# Altium integrated library TI Power Management Battery Management.IntLib: 950 symbols (part 17 of 48)
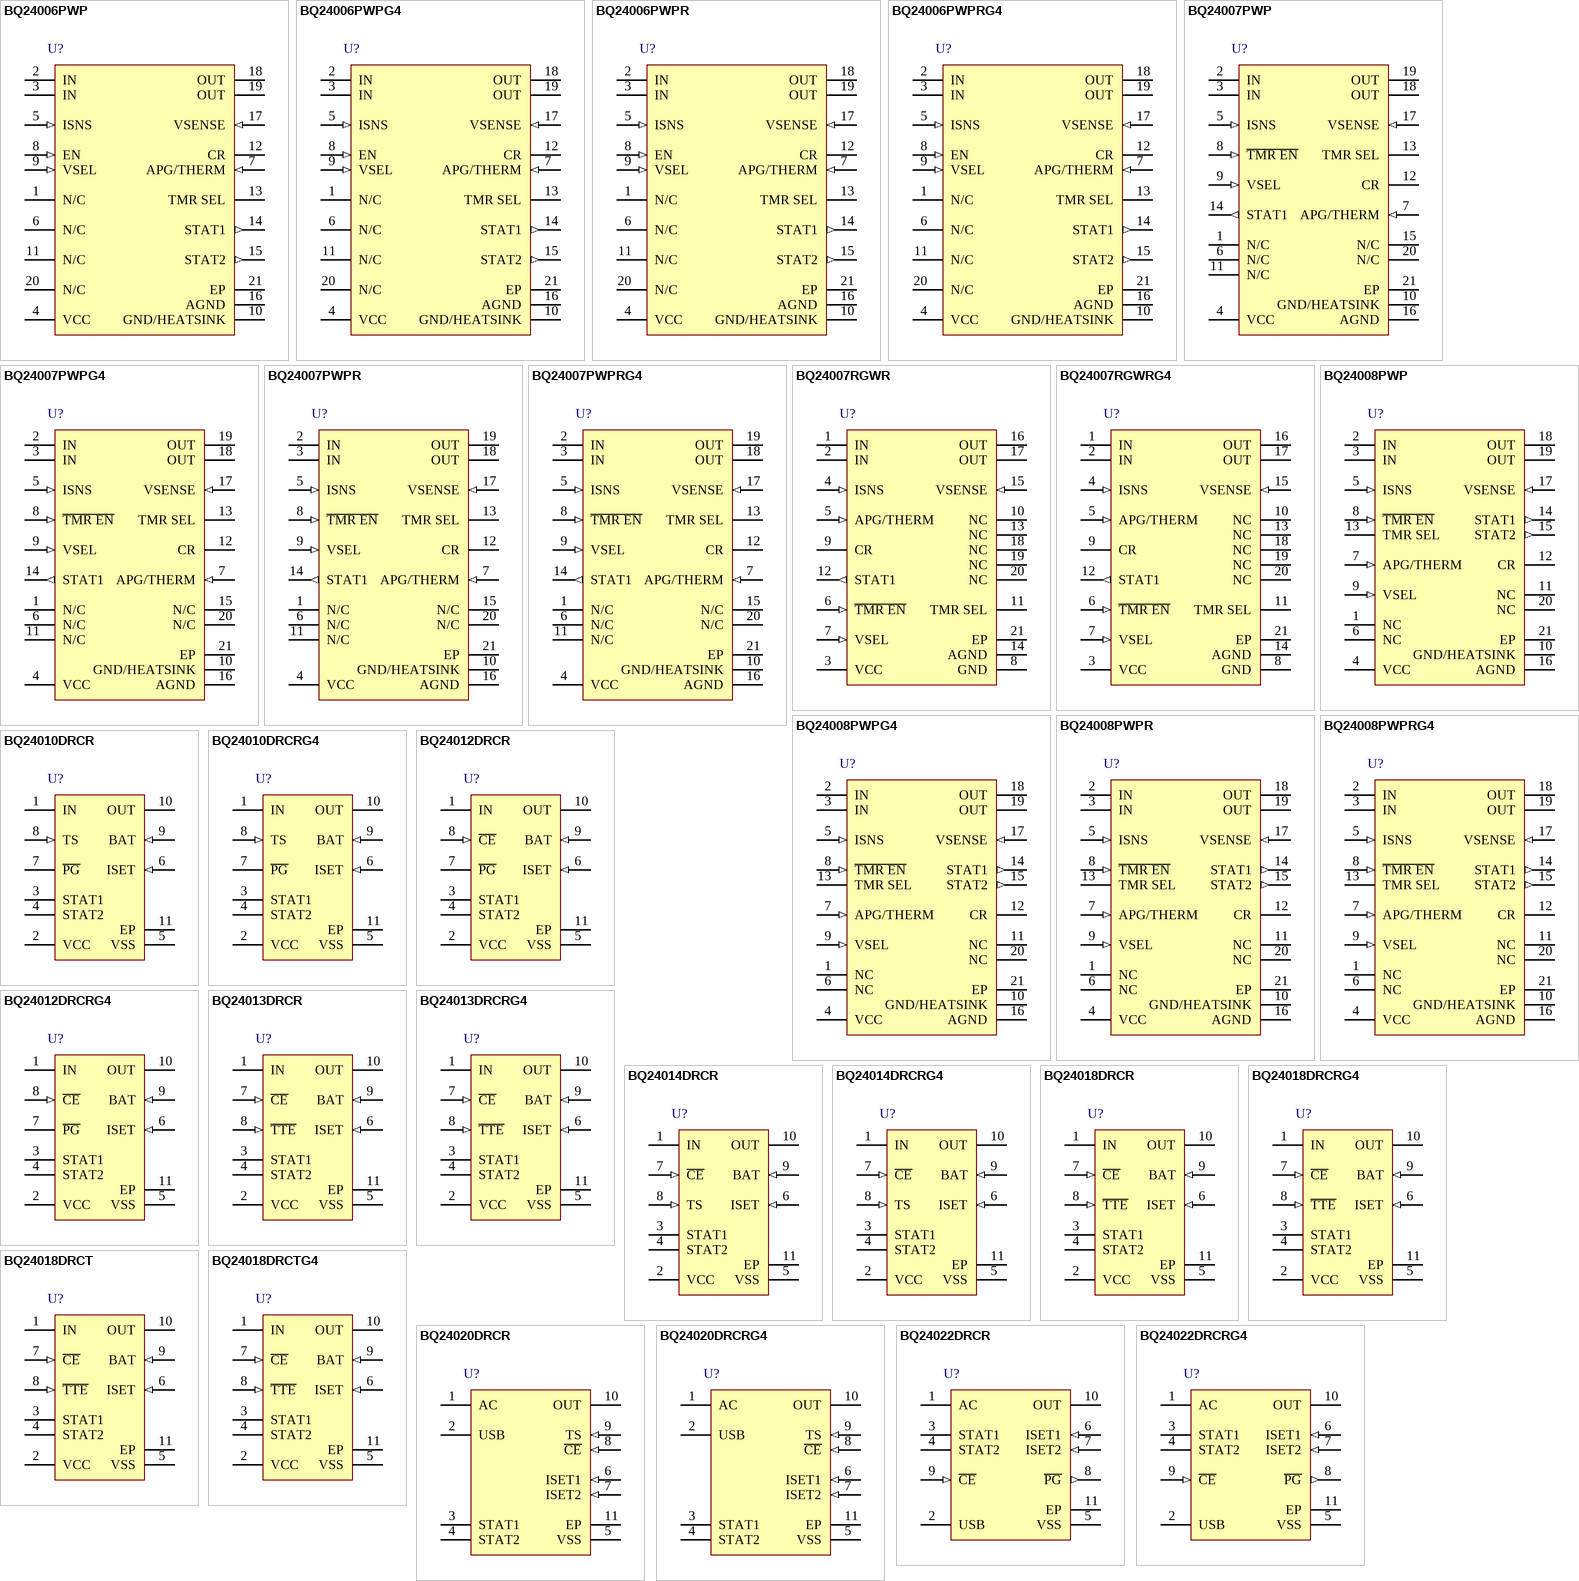
[diagram p50: symbols BQ24006PWP to BQ24022DRCRG4]

## BQ24014DRCRG4
designator U?
bqTINY(TM) Linear 1-Cell Li-Ion Charger with 1 A FET, Temp Sense & Charge Enable in QFN-10, 3 V, -40 to 85 degC, 10-pin SON (DRC), Green (RoHS & no Sb/Br); PartNumber: BQ24014DRCRG4; Manufacturer: Texas Instruments; Lead Acid: N; Li-Ion: Y; SubFamily: Battery Charge Management; Vin(Min)(V): 3; DatasheetVersion: SLUS530J; PackageVersion: revL, Sep-2011; PackageReference: DRC10-2400X1650TP; PackageDescription: 10-Pin Plastic Small Outline No-Lead, 3 x 3 x 1 mm Body, 0.5 mm Pitch, Exposed Pad; Supplier 1: Digi-Key; Supplier Part Number 1: BQ24014DRCRG4-ND; Supplier Part Number 3: 595-BQ24014DRCRG4; Eco-Plan: Green (RoHS & no Sb/Br); Li-Polymer: Y; NiCd: N; NiMH: N; Over Voltage Protection: N; Mounting Technology: Surface Mount; ComponentLink1Description: Datasheet; ComponentLink1URL: http://www.ti.com/general/docs/lit/getliterature.tsp?genericPartNumber=BQ24014&fileType=pdf
footprint DRC10-2400X1650TP (SON, 10-Leads, Body 3x3mm, Pitch 0.5mm, Thermal Pad 2.4x1.65mm, TI Recommended)
pins: 1 IN (power) "Charge input voltage. This input must be tied to the VCC pin.", 2 VCC (power) "VCC supply input", 3 STAT1 (oc) "Charge status output 1 (open collector)", 4 STAT2 (oc) "Charge status output 2 (open collector)", 5 VSS (power) "Ground input", 6 ISET (in) "Charge current set point", 7 ~{CE} (in) "Charge enable input (active low)", 8 TS (in) "Temperature sense input", 9 BAT (in) "Battery voltage sense input", 10 OUT (power) "Charge current output", 11 EP (power) "There is an internal electrical connection between the exposed thermal pad and VSS pin of the device. The exposed thermal pad must be connected to the same potential as the Vss pin on the printed circuit board. Do not use (See Datasheet)"

## BQ24018DRCR
designator U?
Single Chip Li-Ion Charge Management IC for Handheld Applications (bqTINY), 3 V, -40 to 125 degC, 10-pin SON (DRC), Green (RoHS & no Sb/Br); PartNumber: BQ24018DRCR; Manufacturer: Texas Instruments; Lead Acid: N; Li-Ion: Y; SubFamily: Battery Charge Management; Vin(Min)(V): 3; DatasheetVersion: SLUS530J; PackageVersion: revL, Sep-2011; PackageReference: DRC10-2400X1650TP; PackageDescription: 10-Pin Plastic Small Outline No-Lead, 3 x 3 x 1 mm Body, 0.5 mm Pitch, Exposed Pad; Supplier 1: Digi-Key; Supplier Part Number 1: 296-22086-2-ND; Supplier Part Number 3: 296-22086-6-ND; Eco-Plan: Green (RoHS & no Sb/Br); Li-Polymer: Y; NiCd: N; NiMH: N; Over Voltage Protection: N; Mounting Technology: Surface Mount; ComponentLink1Description: Datasheet; ComponentLink1URL: http://www.ti.com/general/docs/lit/getliterature.tsp?genericPartNumber=BQ24018&fileType=pdf
footprint DRC10-2400X1650TP (SON, 10-Leads, Body 3x3mm, Pitch 0.5mm, Thermal Pad 2.4x1.65mm, TI Recommended)
pins: 1 IN (power) "Charge input voltage. This input must be tied to the VCC pin.", 2 VCC (power) "VCC supply input", 3 STAT1 (oc) "Charge status output 1 (open collector)", 4 STAT2 (oc) "Charge status output 2 (open collector)", 5 VSS (power) "Ground input", 6 ISET (in) "Charge current set point", 7 ~{CE} (in) "Charge enable input (active low)", 8 ~{TTE} (in) "Timer and termination enable input (active low)", 9 BAT (in) "Battery voltage sense input", 10 OUT (power) "Charge current output", 11 EP (power) "There is an internal electrical connection between the exposed thermal pad and VSS pin of the device. The exposed thermal pad must be connected to the same potential as the Vss pin on the printed circuit board. Do not use (See Datasheet)"

## BQ24018DRCRG4
designator U?
Single Chip Li-Ion Charge Management IC for Handheld Applications (bqTINY), 3 V, -40 to 125 degC, 10-pin SON (DRC), Green (RoHS & no Sb/Br); PartNumber: BQ24018DRCRG4; Manufacturer: Texas Instruments; Lead Acid: N; Li-Ion: Y; SubFamily: Battery Charge Management; Vin(Min)(V): 3; DatasheetVersion: SLUS530J; PackageVersion: revL, Sep-2011; PackageReference: DRC10-2400X1650TP; PackageDescription: 10-Pin Plastic Small Outline No-Lead, 3 x 3 x 1 mm Body, 0.5 mm Pitch, Exposed Pad; Supplier 1: Digi-Key; Supplier Part Number 1: BQ24018DRCRG4-ND; Supplier Part Number 3: 595-BQ24018DRCRG4; Eco-Plan: Green (RoHS & no Sb/Br); Li-Polymer: Y; NiCd: N; NiMH: N; Over Voltage Protection: N; Mounting Technology: Surface Mount; ComponentLink1Description: Datasheet; ComponentLink1URL: http://www.ti.com/general/docs/lit/getliterature.tsp?genericPartNumber=BQ24018&fileType=pdf
footprint DRC10-2400X1650TP (SON, 10-Leads, Body 3x3mm, Pitch 0.5mm, Thermal Pad 2.4x1.65mm, TI Recommended)
pins: 1 IN (power) "Charge input voltage. This input must be tied to the VCC pin.", 2 VCC (power) "VCC supply input", 3 STAT1 (oc) "Charge status output 1 (open collector)", 4 STAT2 (oc) "Charge status output 2 (open collector)", 5 VSS (power) "Ground input", 6 ISET (in) "Charge current set point", 7 ~{CE} (in) "Charge enable input (active low)", 8 ~{TTE} (in) "Timer and termination enable input (active low)", 9 BAT (in) "Battery voltage sense input", 10 OUT (power) "Charge current output", 11 EP (power) "There is an internal electrical connection between the exposed thermal pad and VSS pin of the device. The exposed thermal pad must be connected to the same potential as the Vss pin on the printed circuit board. Do not use (See Datasheet)"

## BQ24018DRCT
designator U?
Single Chip Li-Ion Charge Management IC for Handheld Applications (bqTINY), 3 V, -40 to 125 degC, 10-pin SON (DRC), Green (RoHS & no Sb/Br); PartNumber: BQ24018DRCT; Manufacturer: Texas Instruments; Lead Acid: N; Li-Ion: Y; SubFamily: Battery Charge Management; Vin(Min)(V): 3; DatasheetVersion: SLUS530J; PackageVersion: revL, Sep-2011; PackageReference: DRC10-2400X1650TP; PackageDescription: 10-Pin Plastic Small Outline No-Lead, 3 x 3 x 1 mm Body, 0.5 mm Pitch, Exposed Pad; Supplier 1: Digi-Key; Supplier Part Number 1: BQ24018DRCT-ND; Supplier Part Number 3: 33P6574; Eco-Plan: Green (RoHS & no Sb/Br); Li-Polymer: Y; NiCd: N; NiMH: N; Over Voltage Protection: N; Mounting Technology: Surface Mount; ComponentLink1Description: Datasheet; ComponentLink1URL: http://www.ti.com/general/docs/lit/getliterature.tsp?genericPartNumber=BQ24018&fileType=pdf
footprint DRC10-2400X1650TP (SON, 10-Leads, Body 3x3mm, Pitch 0.5mm, Thermal Pad 2.4x1.65mm, TI Recommended)
pins: 1 IN (power) "Charge input voltage. This input must be tied to the VCC pin.", 2 VCC (power) "VCC supply input", 3 STAT1 (oc) "Charge status output 1 (open collector)", 4 STAT2 (oc) "Charge status output 2 (open collector)", 5 VSS (power) "Ground input", 6 ISET (in) "Charge current set point", 7 ~{CE} (in) "Charge enable input (active low)", 8 ~{TTE} (in) "Timer and termination enable input (active low)", 9 BAT (in) "Battery voltage sense input", 10 OUT (power) "Charge current output", 11 EP (power) "There is an internal electrical connection between the exposed thermal pad and VSS pin of the device. The exposed thermal pad must be connected to the same potential as the Vss pin on the printed circuit board. Do not use (See Datasheet)"

## BQ24018DRCTG4
designator U?
Single Chip Li-Ion Charge Management IC for Handheld Applications (bqTINY), 3 V, -40 to 125 degC, 10-pin SON (DRC), Green (RoHS & no Sb/Br); PartNumber: BQ24018DRCTG4; Manufacturer: Texas Instruments; Lead Acid: N; Li-Ion: Y; SubFamily: Battery Charge Management; Vin(Min)(V): 3; DatasheetVersion: SLUS530J; PackageVersion: revL, Sep-2011; PackageReference: DRC10-2400X1650TP; PackageDescription: 10-Pin Plastic Small Outline No-Lead, 3 x 3 x 1 mm Body, 0.5 mm Pitch, Exposed Pad; Supplier 1: Digi-Key; Supplier Part Number 1: BQ24018DRCTG4-ND; Supplier Part Number 3: 595-BQ24018DRCTG4; Eco-Plan: Green (RoHS & no Sb/Br); Li-Polymer: Y; NiCd: N; NiMH: N; Over Voltage Protection: N; Mounting Technology: Surface Mount; ComponentLink1Description: Datasheet; ComponentLink1URL: http://www.ti.com/general/docs/lit/getliterature.tsp?genericPartNumber=BQ24018&fileType=pdf
footprint DRC10-2400X1650TP (SON, 10-Leads, Body 3x3mm, Pitch 0.5mm, Thermal Pad 2.4x1.65mm, TI Recommended)
pins: 1 IN (power) "Charge input voltage. This input must be tied to the VCC pin.", 2 VCC (power) "VCC supply input", 3 STAT1 (oc) "Charge status output 1 (open collector)", 4 STAT2 (oc) "Charge status output 2 (open collector)", 5 VSS (power) "Ground input", 6 ISET (in) "Charge current set point", 7 ~{CE} (in) "Charge enable input (active low)", 8 ~{TTE} (in) "Timer and termination enable input (active low)", 9 BAT (in) "Battery voltage sense input", 10 OUT (power) "Charge current output", 11 EP (power) "There is an internal electrical connection between the exposed thermal pad and VSS pin of the device. The exposed thermal pad must be connected to the same potential as the Vss pin on the printed circuit board. Do not use (See Datasheet)"

## BQ24020DRCR
designator U?
bqTINY-II Dual Input USB / AC Adpater 1-Cell Li-Ion Charger with Charge Enable & Temp Sense in QFN-10, 4.5 V, -40 to 125 degC, 10-pin SON (DRC), Green (RoHS & no Sb/Br); PartNumber: BQ24020DRCR; Manufacturer: Texas Instruments; Lead Acid: N; Li-Ion: Y; SubFamily: Battery Charge Management; Vin(Min)(V): 4.5; DatasheetVersion: SLUS549E; PackageVersion: revL, Sep-2011; PackageReference: DRC10-2400X1650TP; PackageDescription: 10-Pin Plastic Small Outline No-Lead, 3 x 3 x 1 mm Body, 0.5 mm Pitch, Exposed Pad; Supplier 1: Digi-Key; Supplier Part Number 1: 296-14072-2-ND; Supplier Part Number 3: 296-14072-6-ND; Eco-Plan: Green (RoHS & no Sb/Br); Li-Polymer: Y; NiCd: N; NiMH: N; Over Voltage Protection: N; Mounting Technology: Surface Mount; ComponentLink1Description: Datasheet; ComponentLink1URL: http://www.ti.com/general/docs/lit/getliterature.tsp?genericPartNumber=BQ24020&fileType=pdf
footprint DRC10-2400X1650TP (SON, 10-Leads, Body 3x3mm, Pitch 0.5mm, Thermal Pad 2.4x1.65mm, TI Recommended)
pins: 1 AC (power) "AC charge input voltage", 2 USB (power) "USB charge input voltage", 3 STAT1 (oc) "Charge status output 1 (open-drain)", 4 STAT2 (oc) "Charge status output 2 (open-drain)", 5 VSS (power) "Ground input", 6 ISET1 (in) "Charge current set point for AC input and precharge ande taper set point for both AC and USB", 7 ISET2 (in) "Charge current set point for USB port (high=500 mA, low=100 mA, hi-z = disable USB charge)", 8 ~{CE} (in) "Charge enable input (active low)", 9 TS (in) "Temperature sense input", 10 OUT (power) "Charge current output", 11 EP (power) "There is an internal electrical connection between the exposed thermal pad and VSS pin of the device. The exposed thermal pad must be connected to the same potential as the VSS pin on the printed circuit board. Do not use (See Datasheet)"

## BQ24020DRCRG4
designator U?
bqTINY-II Dual Input USB / AC Adpater 1-Cell Li-Ion Charger with Charge Enable & Temp Sense in QFN-10, 4.5 V, -40 to 125 degC, 10-pin SON (DRC), Green (RoHS & no Sb/Br); PartNumber: BQ24020DRCRG4; Manufacturer: Texas Instruments; Lead Acid: N; Li-Ion: Y; SubFamily: Battery Charge Management; Vin(Min)(V): 4.5; DatasheetVersion: SLUS549E; PackageVersion: revL, Sep-2011; PackageReference: DRC10-2400X1650TP; PackageDescription: 10-Pin Plastic Small Outline No-Lead, 3 x 3 x 1 mm Body, 0.5 mm Pitch, Exposed Pad; Supplier 1: Digi-Key; Supplier Part Number 1: BQ24020DRCRG4-ND; Supplier Part Number 3: 595-BQ24020DRCRG4; Eco-Plan: Green (RoHS & no Sb/Br); Li-Polymer: Y; NiCd: N; NiMH: N; Over Voltage Protection: N; Mounting Technology: Surface Mount; ComponentLink1Description: Datasheet; ComponentLink1URL: http://www.ti.com/general/docs/lit/getliterature.tsp?genericPartNumber=BQ24020&fileType=pdf
footprint DRC10-2400X1650TP (SON, 10-Leads, Body 3x3mm, Pitch 0.5mm, Thermal Pad 2.4x1.65mm, TI Recommended)
pins: 1 AC (power) "AC charge input voltage", 2 USB (power) "USB charge input voltage", 3 STAT1 (oc) "Charge status output 1 (open-drain)", 4 STAT2 (oc) "Charge status output 2 (open-drain)", 5 VSS (power) "Ground input", 6 ISET1 (in) "Charge current set point for AC input and precharge ande taper set point for both AC and USB", 7 ISET2 (in) "Charge current set point for USB port (high=500 mA, low=100 mA, hi-z = disable USB charge)", 8 ~{CE} (in) "Charge enable input (active low)", 9 TS (in) "Temperature sense input", 10 OUT (power) "Charge current output", 11 EP (power) "There is an internal electrical connection between the exposed thermal pad and VSS pin of the device. The exposed thermal pad must be connected to the same potential as the VSS pin on the printed circuit board. Do not use (See Datasheet)"

## BQ24022DRCR
designator U?
bqTINY-II Dual Input USB / AC Adpater 1-Cell Li-Ion Charger with Charge Enable & Power Good in QFN-10, 4.5 V, -40 to 125 degC, 10-pin SON (DRC), Green (RoHS & no Sb/Br); PartNumber: BQ24022DRCR; Manufacturer: Texas Instruments; Lead Acid: N; Li-Ion: Y; SubFamily: Battery Charge Management; Vin(Min)(V): 4.5; DatasheetVersion: SLUS549E; PackageVersion: revL, Sep-2011; PackageReference: DRC10-2400X1650TP; PackageDescription: 10-Pin Plastic Small Outline No-Lead, 3 x 3 x 1 mm Body, 0.5 mm Pitch, Exposed Pad; Supplier 1: Digi-Key; Supplier Part Number 1: 296-14397-2-ND; Supplier Part Number 3: 296-14397-6-ND; Eco-Plan: Green (RoHS & no Sb/Br); Li-Polymer: Y; NiCd: N; NiMH: N; Over Voltage Protection: N; Mounting Technology: Surface Mount; ComponentLink1Description: Datasheet; ComponentLink1URL: http://www.ti.com/general/docs/lit/getliterature.tsp?genericPartNumber=BQ24022&fileType=pdf
footprint DRC10-2400X1650TP (SON, 10-Leads, Body 3x3mm, Pitch 0.5mm, Thermal Pad 2.4x1.65mm, TI Recommended)
pins: 1 AC (power) "AC charge input voltage", 2 USB (power) "USB charge input voltage", 3 STAT1 (oc) "Charge status output 1 (open-drain)", 4 STAT2 (oc) "Charge status output 2 (open-drain)", 5 VSS (power) "Ground input", 6 ISET1 (in) "Charge current set point for AC input and precharge ande taper set point for both AC and USB", 7 ISET2 (in) "Charge current set point for USB port (high=500 mA, low=100 mA, hi-z = disable USB charge)", 8 ~{PG} (out) "powergood status output (active low)", 9 ~{CE} (in) "Charge enable input (active low)", 10 OUT (power) "Charge current output", 11 EP (power) "There is an internal electrical connection between the exposed thermal pad and VSS pin of the device. The exposed thermal pad must be connected to the same potential as the VSS pin on the printed circuit board. Do not use (See Datasheet)"

## BQ24022DRCRG4
designator U?
bqTINY-II Dual Input USB / AC Adpater 1-Cell Li-Ion Charger with Charge Enable & Power Good in QFN-10, 4.5 V, -40 to 125 degC, 10-pin SON (DRC), Green (RoHS & no Sb/Br); PartNumber: BQ24022DRCRG4; Manufacturer: Texas Instruments; Lead Acid: N; Li-Ion: Y; SubFamily: Battery Charge Management; Vin(Min)(V): 4.5; DatasheetVersion: SLUS549E; PackageVersion: revL, Sep-2011; PackageReference: DRC10-2400X1650TP; PackageDescription: 10-Pin Plastic Small Outline No-Lead, 3 x 3 x 1 mm Body, 0.5 mm Pitch, Exposed Pad; Supplier 1: Digi-Key; Supplier Part Number 1: BQ24022DRCRG4-ND; Supplier Part Number 3: 595-BQ24022DRCRG4; Eco-Plan: Green (RoHS & no Sb/Br); Li-Polymer: Y; NiCd: N; NiMH: N; Over Voltage Protection: N; Mounting Technology: Surface Mount; ComponentLink1Description: Datasheet; ComponentLink1URL: http://www.ti.com/general/docs/lit/getliterature.tsp?genericPartNumber=BQ24022&fileType=pdf
footprint DRC10-2400X1650TP (SON, 10-Leads, Body 3x3mm, Pitch 0.5mm, Thermal Pad 2.4x1.65mm, TI Recommended)
pins: 1 AC (power) "AC charge input voltage", 2 USB (power) "USB charge input voltage", 3 STAT1 (oc) "Charge status output 1 (open-drain)", 4 STAT2 (oc) "Charge status output 2 (open-drain)", 5 VSS (power) "Ground input", 6 ISET1 (in) "Charge current set point for AC input and precharge ande taper set point for both AC and USB", 7 ISET2 (in) "Charge current set point for USB port (high=500 mA, low=100 mA, hi-z = disable USB charge)", 8 ~{PG} (out) "powergood status output (active low)", 9 ~{CE} (in) "Charge enable input (active low)", 10 OUT (power) "Charge current output", 11 EP (power) "There is an internal electrical connection between the exposed thermal pad and VSS pin of the device. The exposed thermal pad must be connected to the same potential as the VSS pin on the printed circuit board. Do not use (See Datasheet)"

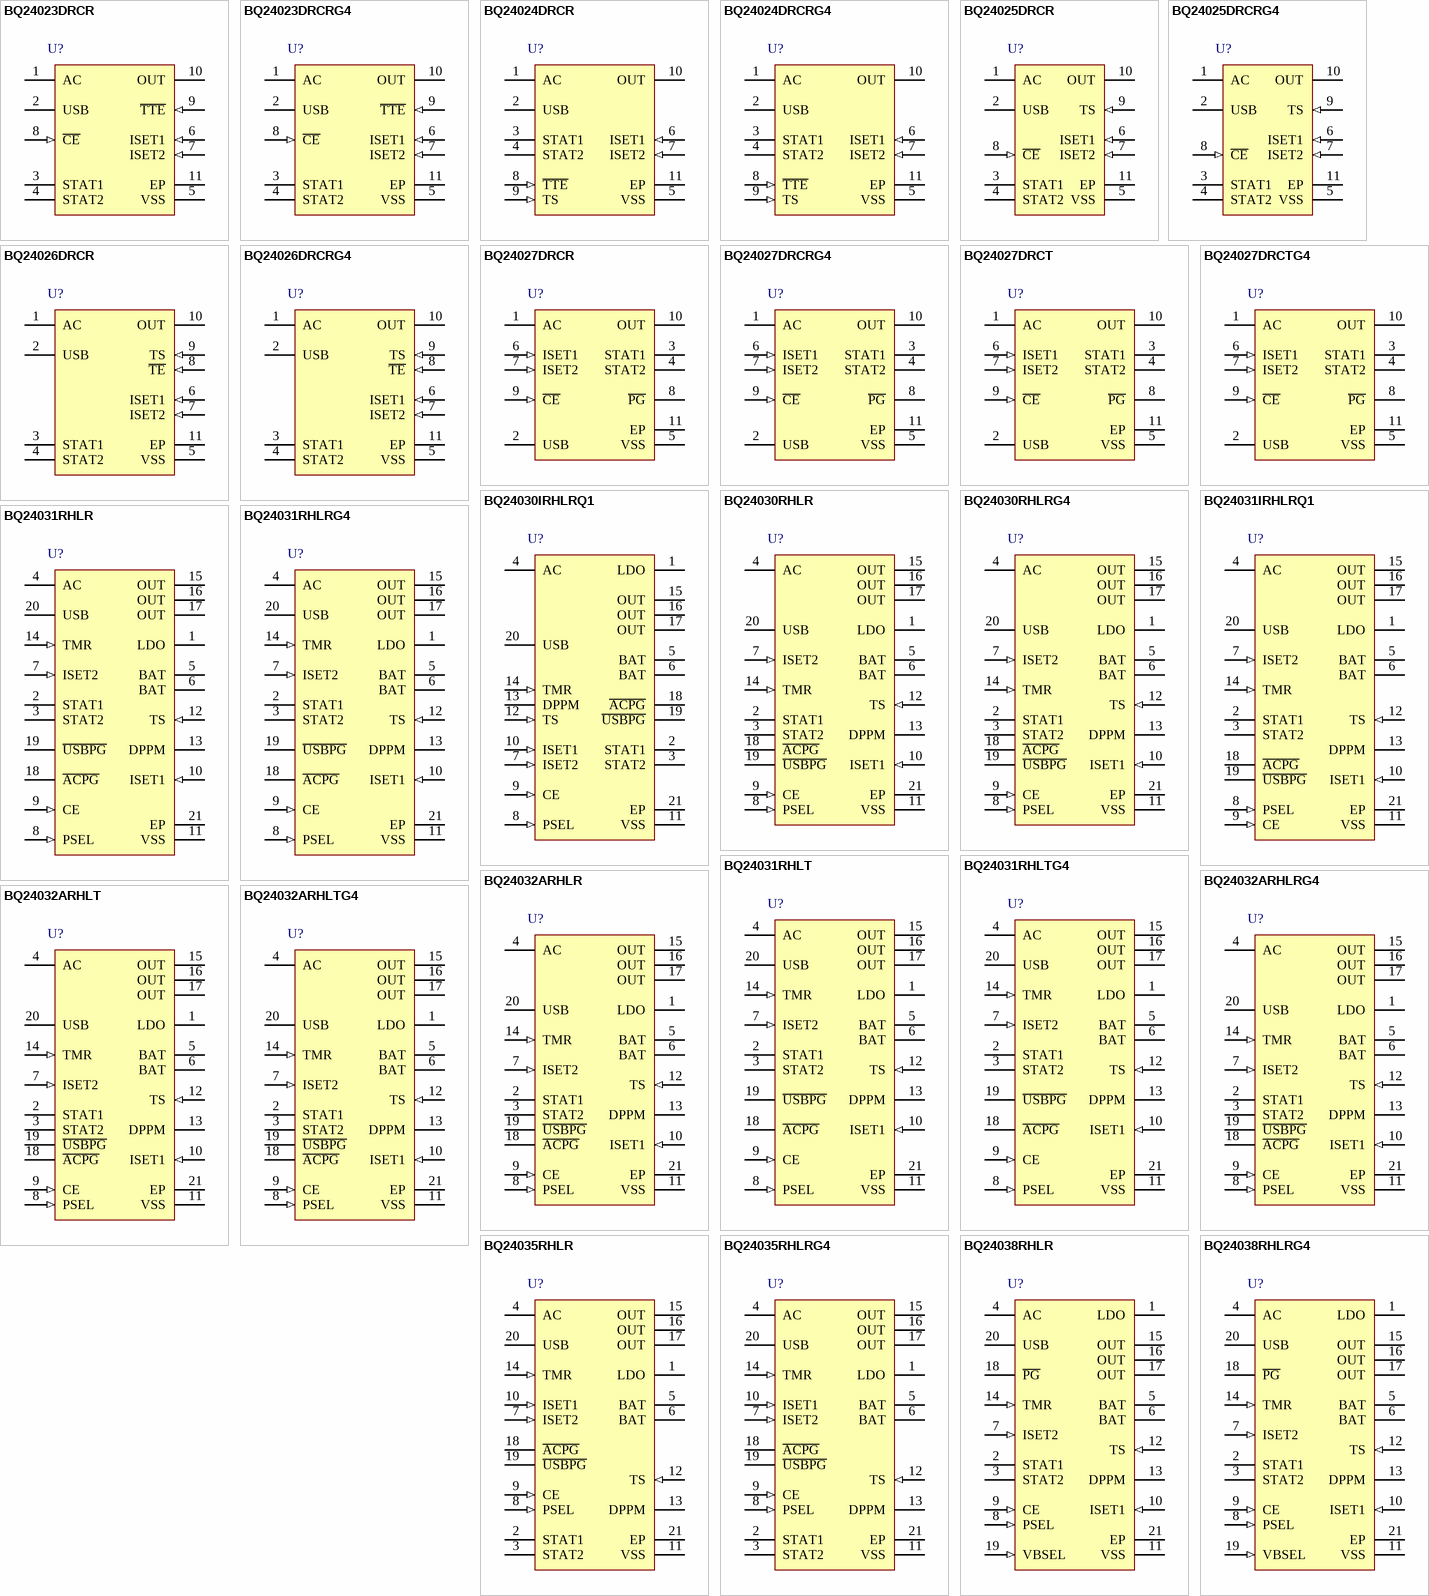
[diagram p13: symbols BQ24023DRCR to BQ24038RHLRG4]

## BQ24023DRCR
designator U?
bqTINY-II Dual Input USB / AC Adpater 1-Cell Li-Ion Charger with Charge Enable, Term Enable in QFN-10, 4.5 V, -40 to 85 degC, 10-pin SON (DRC), Green (RoHS & no Sb/Br); PartNumber: BQ24023DRCR; Manufacturer: Texas Instruments; Lead Acid: N; Li-Ion: Y; SubFamily: Battery Charge Management; Vin(Min)(V): 4.5; DatasheetVersion: SLUS549E; PackageVersion: revL, Sep-2011; PackageReference: DRC10-2400X1650TP; PackageDescription: 10-Pin Plastic Small Outline No-Lead, 3 x 3 x 1 mm Body, 0.5 mm Pitch, Exposed Pad; Supplier 1: Digi-Key; Supplier Part Number 1: 296-15182-2-ND; Supplier Part Number 3: 296-15182-6-ND; Eco-Plan: Green (RoHS & no Sb/Br); Li-Polymer: Y; NiCd: N; NiMH: N; Over Voltage Protection: N; Mounting Technology: Surface Mount; ComponentLink1Description: Datasheet; ComponentLink1URL: http://www.ti.com/general/docs/lit/getliterature.tsp?genericPartNumber=BQ24023&fileType=pdf
footprint DRC10-2400X1650TP (SON, 10-Leads, Body 3x3mm, Pitch 0.5mm, Thermal Pad 2.4x1.65mm, TI Recommended)
pins: 1 AC (power) "AC charge input voltage", 2 USB (power) "USB charge input voltage", 3 STAT1 (oc) "Charge status output 1 (open-drain)", 4 STAT2 (oc) "Charge status output 2 (open-drain)", 5 VSS (power) "Ground input", 6 ISET1 (in) "Charge current set point for AC input and precharge ande taper set point for both AC and USB", 7 ISET2 (in) "Charge current set point for USB port (high=500 mA, low=100 mA, hi-z = disable USB charge)", 8 ~{CE} (in) "Charge enable input (active low)", 9 ~{TTE} (in) "Timer and termination enable input (active low)", 10 OUT (power) "Charge current output", 11 EP (power) "There is an internal electrical connection between the exposed thermal pad and VSS pin of the device. The exposed thermal pad must be connected to the same potential as the VSS pin on the printed circuit board. Do not use (See Datasheet)"

## BQ24023DRCRG4
designator U?
bqTINY-II Dual Input USB / AC Adpater 1-Cell Li-Ion Charger with Charge Enable, Term Enable in QFN-10, 4.5 V, -40 to 85 degC, 10-pin SON (DRC), Green (RoHS & no Sb/Br); PartNumber: BQ24023DRCRG4; Manufacturer: Texas Instruments; Lead Acid: N; Li-Ion: Y; SubFamily: Battery Charge Management; Vin(Min)(V): 4.5; DatasheetVersion: SLUS549E; PackageVersion: revL, Sep-2011; PackageReference: DRC10-2400X1650TP; PackageDescription: 10-Pin Plastic Small Outline No-Lead, 3 x 3 x 1 mm Body, 0.5 mm Pitch, Exposed Pad; Supplier 1: Digi-Key; Supplier Part Number 1: BQ24023DRCRG4-ND; Supplier Part Number 3: 595-BQ24023DRCRG4; Eco-Plan: Green (RoHS & no Sb/Br); Li-Polymer: Y; NiCd: N; NiMH: N; Over Voltage Protection: N; Mounting Technology: Surface Mount; ComponentLink1Description: Datasheet; ComponentLink1URL: http://www.ti.com/general/docs/lit/getliterature.tsp?genericPartNumber=BQ24023&fileType=pdf
footprint DRC10-2400X1650TP (SON, 10-Leads, Body 3x3mm, Pitch 0.5mm, Thermal Pad 2.4x1.65mm, TI Recommended)
pins: 1 AC (power) "AC charge input voltage", 2 USB (power) "USB charge input voltage", 3 STAT1 (oc) "Charge status output 1 (open-drain)", 4 STAT2 (oc) "Charge status output 2 (open-drain)", 5 VSS (power) "Ground input", 6 ISET1 (in) "Charge current set point for AC input and precharge ande taper set point for both AC and USB", 7 ISET2 (in) "Charge current set point for USB port (high=500 mA, low=100 mA, hi-z = disable USB charge)", 8 ~{CE} (in) "Charge enable input (active low)", 9 ~{TTE} (in) "Timer and termination enable input (active low)", 10 OUT (power) "Charge current output", 11 EP (power) "There is an internal electrical connection between the exposed thermal pad and VSS pin of the device. The exposed thermal pad must be connected to the same potential as the VSS pin on the printed circuit board. Do not use (See Datasheet)"

## BQ24024DRCR
designator U?
bqTINY-II Dual Input USB / AC Adpater 1-Cell Li-Ion Charger with Term Enable & Temp Sense in QFN-10, 4.5 V, -40 to 125 degC, 10-pin SON (DRC), Green (RoHS & no Sb/Br); PartNumber: BQ24024DRCR; Manufacturer: Texas Instruments; Lead Acid: N; Li-Ion: Y; SubFamily: Battery Charge Management; Vin(Min)(V): 4.5; DatasheetVersion: SLUS549E; PackageVersion: revL, Sep-2011; PackageReference: DRC10-2400X1650TP; PackageDescription: 10-Pin Plastic Small Outline No-Lead, 3 x 3 x 1 mm Body, 0.5 mm Pitch, Exposed Pad; Supplier 1: Digi-Key; Supplier Part Number 1: 296-17054-2-ND; Supplier Part Number 3: 296-17054-6-ND; Eco-Plan: Green (RoHS & no Sb/Br); Li-Polymer: Y; NiCd: N; NiMH: N; Over Voltage Protection: N; Mounting Technology: Surface Mount; ComponentLink1Description: Datasheet; ComponentLink1URL: http://www.ti.com/general/docs/lit/getliterature.tsp?genericPartNumber=BQ24024&fileType=pdf
footprint DRC10-2400X1650TP (SON, 10-Leads, Body 3x3mm, Pitch 0.5mm, Thermal Pad 2.4x1.65mm, TI Recommended)
pins: 1 AC (power) "AC charge input voltage", 2 USB (power) "USB charge input voltage", 3 STAT1 (oc) "Charge status output 1 (open-drain)", 4 STAT2 (oc) "Charge status output 2 (open-drain)", 5 VSS (power) "Ground input", 6 ISET1 (in) "Charge current set point for AC input and precharge ande taper set point for both AC and USB", 7 ISET2 (in) "Charge current set point for USB port (high=500 mA, low=100 mA, hi-z = disable USB charge)", 8 ~{TTE} (in) "Timer and termination enable input (active low)", 9 TS (in) "Temperature sense input", 10 OUT (power) "Charge current output", 11 EP (power) "There is an internal electrical connection between the exposed thermal pad and VSS pin of the device. The exposed thermal pad must be connected to the same potential as the VSS pin on the printed circuit board. Do not use (See Datasheet)"

## BQ24024DRCRG4
designator U?
bqTINY-II Dual Input USB / AC Adpater 1-Cell Li-Ion Charger with Term Enable & Temp Sense in QFN-10, 4.5 V, -40 to 125 degC, 10-pin SON (DRC), Green (RoHS & no Sb/Br); PartNumber: BQ24024DRCRG4; Manufacturer: Texas Instruments; Lead Acid: N; Li-Ion: Y; SubFamily: Battery Charge Management; Vin(Min)(V): 4.5; DatasheetVersion: SLUS549E; PackageVersion: revL, Sep-2011; PackageReference: DRC10-2400X1650TP; PackageDescription: 10-Pin Plastic Small Outline No-Lead, 3 x 3 x 1 mm Body, 0.5 mm Pitch, Exposed Pad; Supplier 1: Digi-Key; Supplier Part Number 1: BQ24024DRCRG4-ND; Supplier Part Number 3: 595-BQ24024DRCRG4; Eco-Plan: Green (RoHS & no Sb/Br); Li-Polymer: Y; NiCd: N; NiMH: N; Over Voltage Protection: N; Mounting Technology: Surface Mount; ComponentLink1Description: Datasheet; ComponentLink1URL: http://www.ti.com/general/docs/lit/getliterature.tsp?genericPartNumber=BQ24024&fileType=pdf
footprint DRC10-2400X1650TP (SON, 10-Leads, Body 3x3mm, Pitch 0.5mm, Thermal Pad 2.4x1.65mm, TI Recommended)
pins: 1 AC (power) "AC charge input voltage", 2 USB (power) "USB charge input voltage", 3 STAT1 (oc) "Charge status output 1 (open-drain)", 4 STAT2 (oc) "Charge status output 2 (open-drain)", 5 VSS (power) "Ground input", 6 ISET1 (in) "Charge current set point for AC input and precharge ande taper set point for both AC and USB", 7 ISET2 (in) "Charge current set point for USB port (high=500 mA, low=100 mA, hi-z = disable USB charge)", 8 ~{TTE} (in) "Timer and termination enable input (active low)", 9 TS (in) "Temperature sense input", 10 OUT (power) "Charge current output", 11 EP (power) "There is an internal electrical connection between the exposed thermal pad and VSS pin of the device. The exposed thermal pad must be connected to the same potential as the VSS pin on the printed circuit board. Do not use (See Datasheet)"

## BQ24025DRCR
designator U?
bqTINY-II Dual Input USB / AC Adpater 1-Cell Li-Ion Charger with Charge Enable & Temp Sense, 7 hr Timer, 4.5 V, -40 to 85 degC, 10-pin SON (DRC), Green (RoHS & no Sb/Br); PartNumber: BQ24025DRCR; Manufacturer: Texas Instruments; Lead Acid: N; SubFamily: Battery Charge Management; Vin(Min)(V): 4.5; DatasheetVersion: SLUS549E; PackageVersion: revL, Sep-2011; PackageReference: DRC10-2400X1650TP; PackageDescription: 10-Pin Plastic Small Outline No-Lead, 3 x 3 x 1 mm Body, 0.5 mm Pitch, Exposed Pad; Supplier 1: Digi-Key; Supplier Part Number 1: 296-15760-2-ND; Supplier Part Number 3: 296-15760-6-ND; Eco-Plan: Green (RoHS & no Sb/Br); Li-Ion: N; Li-Polymer: N; NiCd: N; NiMH: N; Over Voltage Protection: N; Mounting Technology: Surface Mount; ComponentLink1Description: Datasheet; ComponentLink1URL: http://www.ti.com/general/docs/lit/getliterature.tsp?genericPartNumber=BQ24025&fileType=pdf
footprint DRC10-2400X1650TP (SON, 10-Leads, Body 3x3mm, Pitch 0.5mm, Thermal Pad 2.4x1.65mm, TI Recommended)
pins: 1 AC (power) "AC charge input voltage", 2 USB (power) "USB charge input voltage", 3 STAT1 (oc) "Charge status output 1 (open-drain)", 4 STAT2 (oc) "Charge status output 2 (open-drain)", 5 VSS (power) "Ground input", 6 ISET1 (in) "Charge current set point for AC input and precharge and taper set point for both AC and USB", 7 ISET2 (in) "Charge current set point for USB port (high=500 mA, low=100 mA, hi-z = disable USB charge)", 8 ~{CE} (in) "Charge enable input (active low)", 9 TS (in) "Temperature sense input", 10 OUT (power) "Charge current output", 11 EP (power) "There is an internal electrical connection between the exposed thermal pad and VSS pin of the device. The exposed thermal pad must be connected to the same potential as the VSS pin on the printed circuit board. Do not use (See Datasheet)"

## BQ24025DRCRG4
designator U?
bqTINY-II Dual Input USB / AC Adpater 1-Cell Li-Ion Charger with Charge Enable & Temp Sense, 7 hr Timer, 4.5 V, -40 to 85 degC, 10-pin SON (DRC), Green (RoHS & no Sb/Br); PartNumber: BQ24025DRCRG4; Manufacturer: Texas Instruments; Lead Acid: N; SubFamily: Battery Charge Management; Vin(Min)(V): 4.5; DatasheetVersion: SLUS549E; PackageVersion: revL, Sep-2011; PackageReference: DRC10-2400X1650TP; PackageDescription: 10-Pin Plastic Small Outline No-Lead, 3 x 3 x 1 mm Body, 0.5 mm Pitch, Exposed Pad; Supplier 1: Digi-Key; Supplier Part Number 1: BQ24025DRCRG4-ND; Supplier Part Number 3: 595-BQ24025DRCRG4; Eco-Plan: Green (RoHS & no Sb/Br); Li-Ion: N; Li-Polymer: N; NiCd: N; NiMH: N; Over Voltage Protection: N; Mounting Technology: Surface Mount; ComponentLink1Description: Datasheet; ComponentLink1URL: http://www.ti.com/general/docs/lit/getliterature.tsp?genericPartNumber=BQ24025&fileType=pdf
footprint DRC10-2400X1650TP (SON, 10-Leads, Body 3x3mm, Pitch 0.5mm, Thermal Pad 2.4x1.65mm, TI Recommended)
pins: 1 AC (power) "AC charge input voltage", 2 USB (power) "USB charge input voltage", 3 STAT1 (oc) "Charge status output 1 (open-drain)", 4 STAT2 (oc) "Charge status output 2 (open-drain)", 5 VSS (power) "Ground input", 6 ISET1 (in) "Charge current set point for AC input and precharge and taper set point for both AC and USB", 7 ISET2 (in) "Charge current set point for USB port (high=500 mA, low=100 mA, hi-z = disable USB charge)", 8 ~{CE} (in) "Charge enable input (active low)", 9 TS (in) "Temperature sense input", 10 OUT (power) "Charge current output", 11 EP (power) "There is an internal electrical connection between the exposed thermal pad and VSS pin of the device. The exposed thermal pad must be connected to the same potential as the VSS pin on the printed circuit board. Do not use (See Datasheet)"
